# Altium footprint library R 6 DSX 04.PcbLib: 27 footprints (part 1 of 2)
Each footprint in its own frame and in the unit in brackets; x right, y up, seen from the top. Pads: shape width x height; smd on the part's side, far side on the other; paste and mask are expansions set on the pad; w line width, h text height; cw(c..) or ccw(c..) is an arc to the next point about the centre after c.
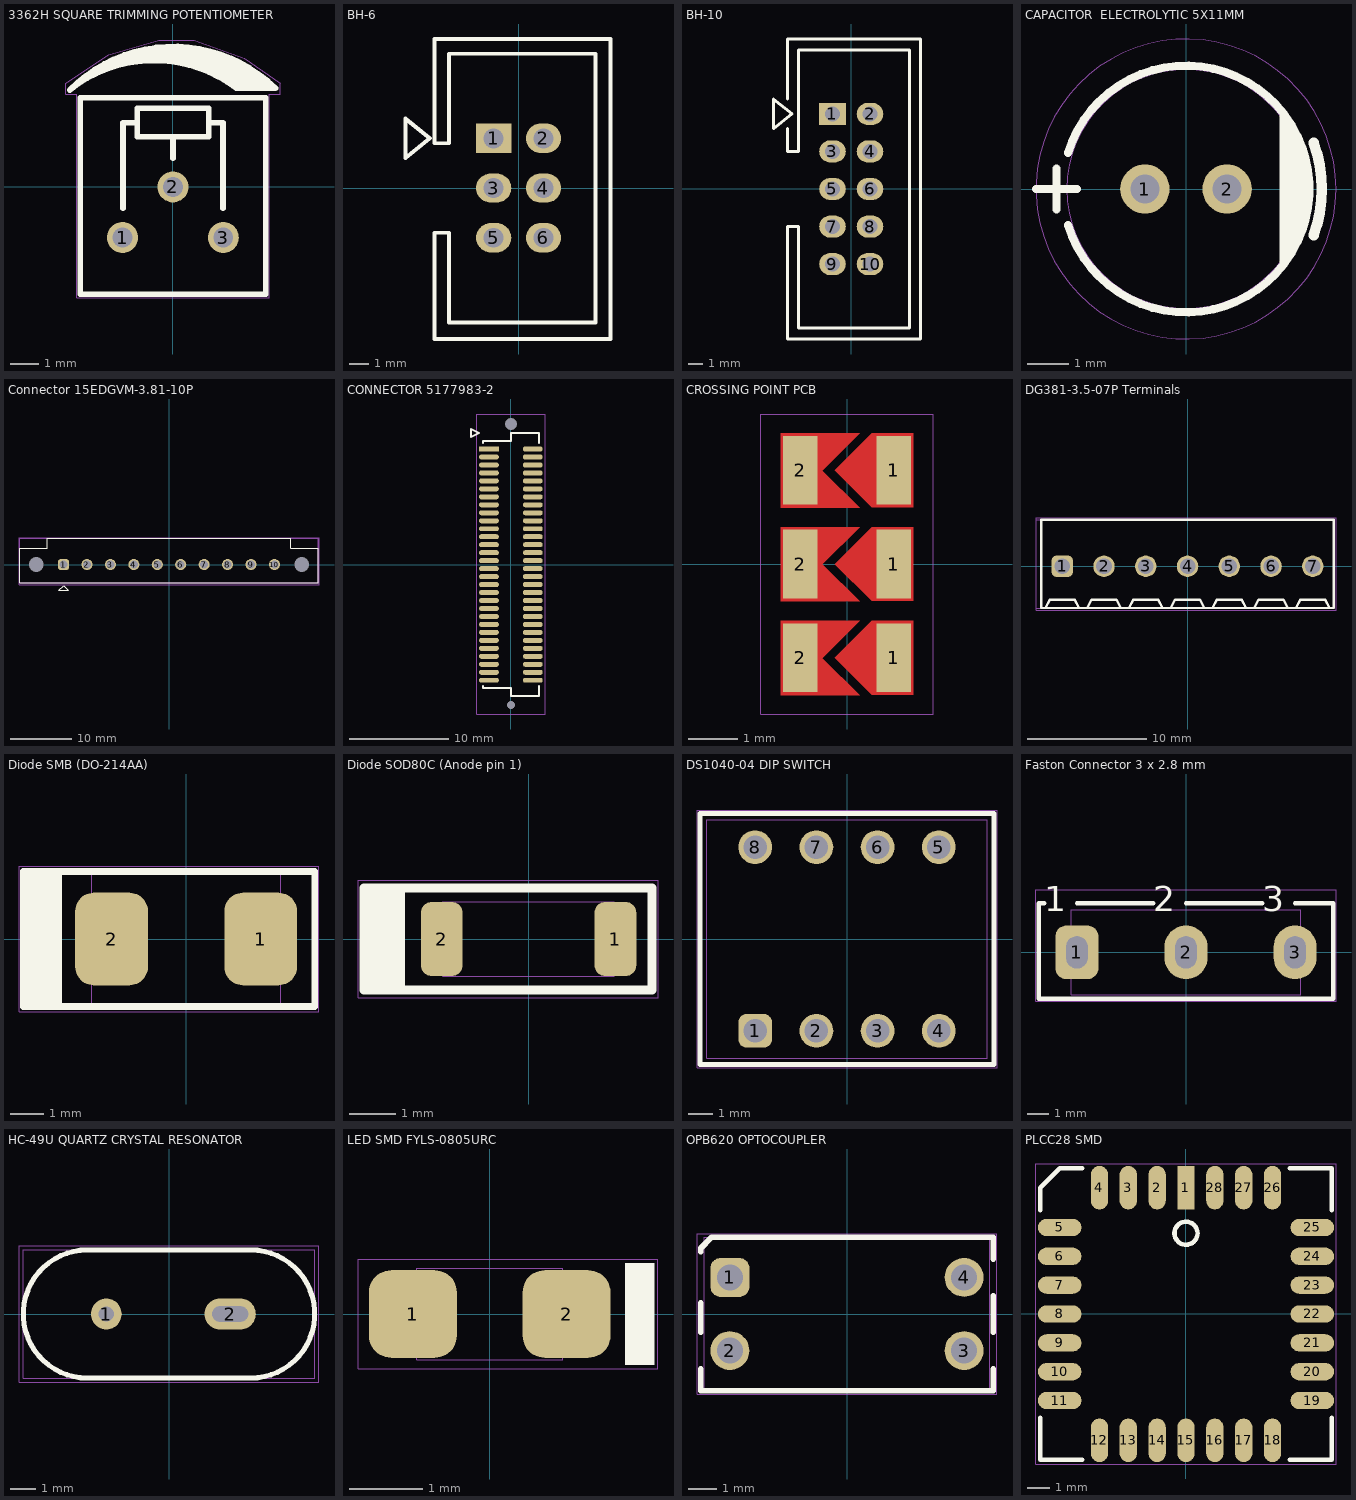
[diagram p0: the footprints below, top view; thin cyan lines are the x and y axes]

## 3362H SQUARE TRIMMING POTENTIOMETER [mm] "Square Trimpot® Trimming Potentiometer"
pads (3):
  round 1.1 / inner round 0 / far side oval 1.1x1.3 hole 0.7: 1(-1.792,-1.8) 2(0,0) 3(1.792,-1.8)
Top Overlay:
  region: 3.645,3.508 2.253,3.505 2.253,4.484
  region: 2.253,3.502 1.321,4.064 2.253,4.484
  region: 2.253,4.484 1.096,4.879 1.321,4.064
  region: 1.096,4.879 0.404,4.375 1.321,4.064
  region: 1.096,4.879 0.051,4.992 0.404,4.375
  region: 0.051,4.992 -0.449,4.493 0.404,4.375
  region: -0.449,4.493 -1.061,4.879 0.051,4.992
  region: -1.061,4.879 -1.751,4.375 -0.449,4.493
  region: -1.061,4.879 -2.201,4.493 -1.751,4.375
  region: -1.751,4.375 -2.667,4.064 -2.201,4.493
  lines w0.2: -1.778,-0.762 -1.778,2.286 -1.27,2.286 ; 0,1.016 0,1.778 ; 1.27,2.286 1.778,2.286 1.778,-0.762 ; 2.245,3.508 ccw(c-0.673,-0.302) -3.672,3.446 cw(c0.017,-0.181) 3.645,3.508 2.259,3.508 ; -3.3,-3.815 -3.3,3.175 3.3,3.175 3.3,-3.815 -3.3,-3.815 ; -1.27,1.778 -1.27,2.794 1.27,2.794 1.27,1.778 -1.27,1.778
Mechanical 3:
  lines w0.01: -3.81,3.302 -3.81,3.683 -2.286,4.699 -0.508,5.207 0.762,5.207 2.54,4.572 3.81,3.683 3.81,3.302 3.429,3.302 3.429,-3.937 -3.429,-3.937 -3.429,3.302 -3.81,3.302
Mechanical 7:
  lines w0.01: -3.3,-3.815 -3.3,3.175 3.3,3.175 3.3,-3.815 -3.3,-3.815
Mechanical 12:
  text ".Designator" at -2.181,-3.68 h4
3D body "3362H v2.STEP": height 4.75, standoff -3, extent -3.3,-3.815 3.3,3.175

## BH-6 [mm] "BH-6 (DS1013-06S) (IDC-6MS)"
height 6.86
pads (6):
  rect 1.8x1.5 hole 1.02: 1(-1.27,2.54)
  oval 1.8x1.5 hole 1.02: 2(1.27,2.54) 3(-1.27,0) 4(1.27,0) 5(-1.27,-2.54) 6(1.27,-2.54)
Top Overlay:
  lines w0.2: -5.778,1.54 -5.778,3.54 -4.528,2.54 -5.778,1.54 ; -4.303,-7.71 -4.303,-2.286 -3.556,-2.286 -3.556,-6.858 3.937,-6.858 3.937,6.858 -3.556,6.858 -3.556,2.286 -4.303,2.286 -4.303,7.61 4.697,7.61 4.697,-7.71 -4.303,-7.71
3D body "DS1013-6S (IDC-6MS, BH-6).step": height 9.05, standoff -3.55, extent -4.4,-7.71 4.4,7.71

## BH-10 [mm] "BH-10 (DS1013-10S) (IDC-10MS)"
height 6.86
pads (10):
  rect 1.8x1.5 hole 1.02: 1(-1.27,5.08)
  oval 1.8x1.5 hole 1.02: 2(1.27,5.08) 3(-1.27,2.54) 4(1.27,2.54) 5(-1.27,0) 6(1.27,0) 7(-1.27,-2.54) 8(1.27,-2.54) 9(-1.27,-5.08) 10(1.27,-5.08)
Top Overlay:
  lines w0.2: -4.303,4.08 -4.303,2.54 -3.556,2.54 -3.556,9.398 3.937,9.398 3.937,-9.398 -3.556,-9.398 -3.556,-2.54 -4.303,-2.54 -4.303,-10.15 4.697,-10.15 4.697,10.15 -4.303,10.15 -4.303,6.08 ; -5.27,4.08 -5.27,6.08 -4.02,5.08 -5.27,4.08
3D body "BH-10.STEP": height 8.95, standoff -3.45, extent -4.303,-10.15 4.697,10.15

## CAPACITOR  ELECTROLYTIC 5X11MM [mm] "Capacitor  electrolytic 5x11mm"
pads (2):
  round 1.2 / inner round 0 / far side oval 1.2x1.6 hole 0.7: 1(-1,0) 2(1,0)
Top Overlay:
  region: 2.286,1.904 2.286,-1.886 2.375,-1.81 2.536,-1.64 2.678,-1.453 2.799,-1.251 2.897,-1.038 2.972,-0.816 3.023,-0.587 3.048,-0.353 3.048,-0.236 3.048,0.254 3.048,0.371 3.023,0.605 2.972,0.834 2.897,1.056 2.799,1.269 2.678,1.471 2.536,1.658 2.375,1.828
  lines w0.2: -3.648,0 -2.648,0 ; -3.148,-0.5 -3.148,0.5 ; -2.87,-0.873 ccw(c0,0) -2.87,0.873
  lines w0.254: 3.103,-1.129 ccw(c0,0) 3.103,1.129
Mechanical 3:
  circle w0.01: c0,0 r3.648
Mechanical 7:
  circle w0.01: c0,0 r2.902
Mechanical 12:
  text ".Designator" at -2.1,1.5 h4
3D body "CAP_RAD_D5x11_POL_BK.stp": height 12.55, standoff -2.45, extent -2.75,-2.75 2.75,2.75

## Connector 15EDGVM-3.81-10P [mm] "15EDGVM-3.81-10P Connector 10 poles by Degson 3.81 mm pitch"
height 6.86
pads (12):
  round 0 hole 2.4 unplated: 0(-21.565,0) 0(21.565,0)
  rrect50% 1.8x1.8 / inner round 1.8 / far side rrect50% 1.8x2.5 hole 1.3: 1(-17.145,0)
  round 1.8 / inner round 1.8 / far side oval 1.8x2.5 hole 1.3: 2(-13.335,0) 3(-9.525,0) 4(-5.715,0) 5(-1.905,0) 6(1.905,0) 7(5.715,0) 8(9.525,0) 9(13.335,0) 10(17.145,0)
Top Overlay:
  lines w0.2: -24.254,-2.978 24.236,-2.978 24.236,2.667 19.794,2.667 19.794,4.262 -19.812,4.262 -19.812,2.667 -24.254,2.667 -24.254,-2.978 ; -17.907,-4.191 -17.145,-3.429 -16.383,-4.191 -17.907,-4.191
Mechanical 3:
  lines w0.01: -24.384,-3.238 -24.384,4.381 24.384,4.381 24.384,-3.238 -24.384,-3.238
Mechanical 7:
  lines w0.01: -24.254,-2.978 -24.254,4.262 24.236,4.262 24.236,-2.978 -24.254,-2.978
Mechanical 12:
  text ".Designator" at -5.473,1.508 h4
3D body "15EDGVM-3.81-10P-1Y-00A(H).stp": height 9.2, standoff -3.4, extent -24.254,-2.978 24.236,4.262

## CONNECTOR 5177983-2 [mm]
pads (62):
  rect 2x0.5 smd: 1(-2.2,11.6)
  oval 2x0.5 smd: 2(2.2,11.6) 3(-2.2,10.8) 4(2.2,10.8) 5(-2.2,10) 6(2.2,10) 7(-2.2,9.2) 8(2.2,9.2) 9(-2.2,8.4) 10(2.2,8.4) 11(-2.2,7.6) 12(2.2,7.6) 13(-2.2,6.8) 14(2.2,6.8) 15(-2.2,6) 16(2.2,6) 17(-2.2,5.2) 18(2.2,5.2) 19(-2.2,4.4) 20(2.2,4.4) 21(-2.2,3.6) 22(2.2,3.6) 23(-2.2,2.8) 24(2.2,2.8) 25(-2.2,2) 26(2.2,2) 27(-2.2,1.2) 28(2.2,1.2) 29(-2.2,0.4) 30(2.2,0.4) 31(-2.2,-0.4) 32(2.2,-0.4) 33(-2.2,-1.2) 34(2.2,-1.2) 35(-2.2,-2) 36(2.2,-2) 37(-2.2,-2.8) 38(2.2,-2.8) 39(-2.2,-3.6) 40(2.2,-3.6) 41(-2.2,-4.4) 42(2.2,-4.4) 43(-2.2,-5.2) 44(2.2,-5.2) 45(-2.2,-6) 46(2.2,-6) 47(-2.2,-6.8) 48(2.2,-6.8) 49(-2.2,-7.6) 50(2.2,-7.6) 51(-2.2,-8.4) 52(2.2,-8.4) 53(-2.2,-9.2) 54(2.2,-9.2) 55(-2.2,-10) 56(2.2,-10) 57(-2.2,-10.8) 58(2.2,-10.8) 59(-2.2,-11.6) 60(2.2,-11.6)
  round 0 hole 1.2 unplated: 61(0,14.1)
  round 0 hole 0.8 unplated: 62(0,-14.1)
Top Overlay:
  lines w0.2: -2.8,-12.2 -2.8,-12.4 0,-12.4 0,-13.2 2.8,-13.2 2.8,-12.2 ; -2.8,12.2 -2.8,12.4 0,12.4 0,13.2 2.8,13.2 2.8,12.2 ; -4,12.8 -3.2,13.2 -4,13.6 -4,12.8
Mechanical 3:
  lines w0.01: -3.429,-14.986 -3.429,-10.541 -3.429,15.113 3.429,15.113 3.429,-14.986 -3.429,-14.986
Mechanical 12:
  text ".Designator" at -4.286,-6.566 h4
3D body "c-5177983-2-a-3d.stp": height 3.8, standoff -0.45, extent -3,-14.9 3,14.9

## CROSSING POINT PCB [mm]
pads (6):
  rect 0.7x1.4 smd paste+0 mask+0: 1(0.95,-1.905) 1(0.95,0) 1(0.95,1.905) 2(-0.95,-1.905) 2(-0.95,0) 2(-0.95,1.905)
Top Layer:
  region: -0.25,-1.905 0.5,-2.655 1.35,-2.655 1.35,-1.155 0.5,-1.155
  region: -1.35,-1.155 0.254,-1.155 -0.502,-1.911 0.254,-2.667 -1.35,-2.667
  region: -1.35,0.75 0.254,0.75 -0.502,-0.006 0.254,-0.762 -1.35,-0.762
  region: -0.25,0 0.5,-0.75 1.35,-0.75 1.35,0.75 0.5,0.75
  region: -1.35,2.655 0.254,2.655 -0.502,1.899 0.254,1.143 -1.35,1.143
  region: -0.25,1.905 0.5,1.155 1.35,1.155 1.35,2.655 0.5,2.655
Top Solder:
  region: -1.45,-1.055 -1.45,-2.755 1.45,-2.755 1.45,-1.055
  region: -1.45,0.85 -1.45,-0.85 1.45,-0.85 1.45,0.85
  region: -1.45,2.755 -1.45,1.055 1.45,1.055 1.45,2.755
Mechanical 10:
  lines w0.01: -1.75,-3.048 1.75,-3.048 1.75,3.048 -1.75,3.048 -1.75,-3.048

## DG381-3.5-07P Terminals [mm] "DG381-3.5-07P Terminal 7 poles by Degson 3.5 mm pitch"
height 6.86
pads (7):
  rrect50% 1.8x1.8 / inner round 1.8 / far side rrect50% 1.8x2.5 hole 1.3: 1(-10.5,0)
  round 1.8 / inner round 1.8 / far side oval 1.8x2.5 hole 1.3: 2(-7,0) 3(-3.5,0) 4(0,0) 5(3.5,0) 6(7,0) 7(10.5,0)
Top Overlay:
  lines w0.2: -11.9,-3.5 -11.55,-2.8 -9.45,-2.8 -9.1,-3.5 ; -8.4,-3.5 -8.05,-2.8 -5.95,-2.8 -5.6,-3.5 ; -4.9,-3.5 -4.55,-2.8 -2.45,-2.8 -2.1,-3.5 ; -1.4,-3.5 -1.05,-2.8 1.05,-2.8 1.4,-3.5 ; 2.1,-3.5 2.45,-2.8 4.55,-2.8 4.9,-3.5 ; 5.6,-3.5 5.95,-2.8 8.05,-2.8 8.4,-3.5 ; 9.1,-3.5 9.45,-2.8 11.55,-2.8 11.9,-3.5 ; -12.25,-3.5 12.26,-3.5 12.26,3.9 -12.25,3.9 -12.25,-3.5
Mechanical 3:
  lines w0.01: -12.7,-3.683 12.446,-3.683 12.446,4.064 -12.7,4.064 -12.7,-3.683
Mechanical 7:
  lines w0.01: -12.66,-3.5 12.26,-3.5 12.26,3.9 -12.66,3.9 -12.66,-3.5
Mechanical 10:
  lines w0.01: -12.66,-3.5 12.26,-3.5 12.26,3.9 -12.66,3.9 -12.66,-3.5
Mechanical 12:
  text ".Designator" at 1.4,-8.4 h4
3D body "DG381-3.5-07P.stp": height 8.65, standoff -3.55, extent -12.66,-3.5 12.26,3.9

## Diode SMB (DO-214AA) [mm]
height 6.86
pads (2):
  rrect50% 2.159x2.743 smd: 1(2.21,0) 2(-2.21,0)
Top Overlay:
  rectangle: -4.828,-2.032 -3.683,2.032
  lines w0.2: -4.826,-2 3.81,-2 3.81,2 -4.826,2 -4.826,-2
Mechanical 3:
  lines w0.01: -4.953,-2.159 3.937,-2.159 3.937,2.159 -4.953,2.159 -4.953,-2.159
Mechanical 7:
  lines w0.01: -2.8,-2 -2.8,2 2.8,2 2.8,-2 -2.8,-2
Mechanical 12:
  text ".Designator" at -7.366,2.286 h4
3D body "DIOM4640X24_DO-214AA_SMB.STEP": height 2.6, standoff 0, extent -2.8,-2 2.8,2

## Diode SOD80C (Anode pin 1) [mm] "Diode SMA (Anode pin 1)"
height 6.86
pads (2):
  rrect50% 0.9x1.6 smd: 1(1.875,0) 2(-1.875,0)
Top Overlay:
  rectangle: -3.556,-1.2 -2.667,1.2
  lines w0.2: -3.556,-1.1 -3.556,1.1 2.667,1.1 2.667,-1.1 -3.556,-1.1
Mechanical 3:
  lines w0.01: -3.683,-1.27 2.794,-1.27 2.794,1.27 -3.683,1.27 -3.683,-1.27
Mechanical 7:
  lines w0.01: -1.85,-0.8 1.85,-0.8 1.85,0.8 -1.85,0.8 -1.85,-0.8
Mechanical 12:
  text ".Designator" at -6.731,1.27 h4
3D body "SOD80C.STEP": height 1.58, standoff -0.02, extent -1.85,-0.8 1.85,0.8

## DS1040-04 DIP SWITCH [mm] "DS1040-04 DIP-switch 4 channels NO by Connfly"
pads (8):
  rrect50% 1.4x1.4 / inner round 0 / far side rrect50% 1.5x2 hole 0.97: 1(-3.81,-3.81)
  round 1.4 / inner round 0 / far side oval 1.5x2 hole 0.97: 2(-1.27,-3.81) 3(1.27,-3.81) 4(3.81,-3.81) 5(3.81,3.81) 6(1.27,3.81) 7(-1.27,3.81) 8(-3.81,3.81)
Top Overlay:
  lines w0.2: -6.096,-5.207 -6.096,5.207 6.096,5.207 6.096,-5.207 -6.096,-5.207
Mechanical 3:
  lines w0.01: -6.223,-5.334 -6.223,5.334 6.223,5.334 6.223,-5.334 -5.207,-5.334 -6.223,-5.334
Mechanical 7:
  lines w0.01: -5.81,-4.95 -5.81,4.95 5.81,4.95 5.81,-4.95 -5.81,-4.95
Mechanical 12:
  text ".Designator" at -2.032,-1.778 h4
3D body "DS1040-04 (DIP_switch).stp": height 6.85, standoff -3.8, extent -5.81,-4.95 5.81,4.95

## Faston Connector 3 x 2.8 mm [mm] "Connector: 3 x Faston Pin 2.8 mm"
height 6.86
pads (3):
  rrect50% 2x2.5 / inner rrect50% 1.6x2 / far side rrect50% 2x2.5 hole 1.5 slot 1 at 0 deg: 1(-5.08,0)
  oval 2x2.5 / inner oval 1.6x2 / far side oval 2x2.5 hole 1.5 slot 1 at 0 deg: 2(0,0) 3(5.08,0)
Top Overlay:
  lines w0.2: -6.604,2.286 -6.858,2.286 -6.858,-2.159 6.858,-2.159 6.858,2.286 5.08,2.286 ; -5.08,2.286 -1.524,2.286 ; 0,2.286 3.556,2.286
  text "3" at 3.556,1.524 h2
  text "2" at -1.524,1.524 h2
  text "1" at -6.604,1.524 h2
Mechanical 3:
  lines w0.01: -6.985,-2.286 6.985,-2.286 6.985,2.921 -6.985,2.921 -6.985,-2.286
Mechanical 7:
  lines w0.01: -5.334,-1.981 5.334,-1.981 5.334,1.981 -5.334,1.981 -5.334,-1.981
Mechanical 12:
  text ".Designator" at -6.604,2.54 h4
3D body "c-62395-1-ae-3d.stp": height 8.45, standoff -3.93, extent 4.826,-1.981 5.334,1.981
3D body "c-62395-1-ae-3d.stp": height 8.45, standoff -3.93, extent -0.254,-1.981 0.254,1.981
3D body "c-62395-1-ae-3d.stp": height 8.45, standoff -3.93, extent -5.334,-1.981 -4.826,1.981

## HC-49U QUARTZ CRYSTAL RESONATOR [mm] "HC-49/U Standard Quartz Crystal"
pads (2):
  round 1.2 / inner round 0 / far side round 1.2 hole 0.6: 1(-2.44,0)
  oval 2x1.2 / inner round 0 / far side oval 2x1.2 hole 0.6 slot 1.4 at 0 deg: 2(2.382,0)
Top Overlay:
  lines w0.2: -3.178,-2.497 cw(c-3.178,0) -3.178,2.497 3.178,2.497 cw(c3.178,0) 3.178,-2.497 -3.178,-2.497
Mechanical 3:
  lines w0.01: -5.842,-2.667 -5.842,2.667 5.842,2.667 5.842,-2.667 -5.842,-2.667
Mechanical 7:
  lines w0.01: -5.675,-2.497 -5.675,2.503 5.675,2.503 5.675,-2.497 -5.675,-2.497
Mechanical 10:
  lines w0.01: -3.16,-2.491 cw(c-3.16,0.006) -3.16,2.503 3.196,2.503 cw(c3.196,0.006) 3.196,-2.491 -3.16,-2.491
Mechanical 12:
  text ".Designator" at -1.905,-0.508 h1
3D body "HC-49S(10.24MHz).STEP": height 3.8, standoff -2.5, extent -5.675,-2.497 5.675,2.503

## LED SMD FYLS-0805URC [mm] "FYLS-0805URC LED SMD"
height 6.86
pads (2):
  rrect50% 1.2x1.2 smd: 1(-1.05,0) 2(1.05,0)
Top Overlay:
  rectangle: 1.85,-0.7 2.25,0.7
Mechanical 3:
  lines w0.01: -1.8,-0.75 2.3,-0.75 2.3,0.75 -1.8,0.75 -1.8,-0.75
Mechanical 7:
  lines w0.01: -1,-0.625 1,-0.625 1,0.625 -1,0.625 -1,-0.625
Mechanical 13:
  text ".Designator" at -1.75,0.75 h4
3D body "FYLS-0805URC.STEP": height 0.81, standoff 0, extent -1,-0.625 1,0.625

## OPB620 OPTOCOUPLER [mm] "OPB620 Optocoupler by TT Electronics"
pads (4):
  rrect50% 1.35x1.35 / inner rrect50% 0x0 / far side rrect50% 1.7x1.7 hole 0.9: 1(-4.065,1.27)
  round 1.35 / inner round 0 / far side round 1.7 hole 0.9: 2(-4.065,-1.27) 3(4.065,-1.27) 4(4.065,1.27)
Top Overlay:
  lines w0.2: -5.08,-1.905 -5.08,-2.667 5.08,-2.667 5.08,-1.905 ; -5.08,-0.635 -5.08,0.381 ; -5.08,2.159 -5.08,2.286 -4.699,2.667 5.08,2.667 5.08,1.905 ; 5.08,-0.635 5.08,0.635
Mechanical 3:
  lines w0.01: -5.207,-2.794 -5.207,2.794 5.207,2.794 5.207,-1.651 5.207,-2.794 -5.207,-2.794
Mechanical 7:
  lines w0.01: -4.955,-2.665 -4.955,2.665 4.955,2.665 4.955,-2.665 -4.955,-2.665
Mechanical 12:
  text ".Designator" at -2.032,-0.508 h4
3D body "OPB620.STEP": height 9.27, standoff -2.16, extent -4.955,-2.665 4.955,2.665

## PLCC28 SMD [mm]
height 6.86
pads (28):
  rect 0.76x1.92 smd: 1(0,5.56)
  oval 0.76x1.92 smd: 2(-1.27,5.56) 3(-2.54,5.56) 4(-3.81,5.56) 12(-3.81,-5.56) 13(-2.54,-5.56) 14(-1.27,-5.56) 15(0,-5.56) 16(1.27,-5.56) 17(2.54,-5.56) 18(3.81,-5.56) 26(3.81,5.56) 27(2.54,5.56) 28(1.27,5.56)
  oval 1.92x0.76 smd: 5(-5.56,3.81) 6(-5.56,2.54) 7(-5.56,1.27) 8(-5.56,0) 9(-5.56,-1.27) 10(-5.56,-2.54) 11(-5.56,-3.81) 19(5.56,-3.81) 20(5.56,-2.54) 21(5.56,-1.27) 22(5.56,0) 23(5.56,1.27) 24(5.56,2.54) 25(5.56,3.81)
Top Overlay:
  circle w0.2: c0,3.556 r0.508
  lines w0.2: -6.42,-4.57 -6.42,-6.42 -4.57,-6.42 ; -6.42,4.57 -6.42,5.56 -5.56,6.42 -4.57,6.42 ; 4.57,-6.42 6.42,-6.42 6.42,-4.57 ; 4.57,6.42 6.42,6.42 6.42,4.57
Mechanical 3:
  lines w0.01: -6.604,-6.604 -6.604,6.604 6.604,6.604 6.604,-6.604 -6.604,-6.604
Mechanical 12:
  text ".Designator" at -6.604,7.112 h4
3D body "MT9172AP.STEP": height 4.57, standoff 0, extent -6.225,-6.225 6.225,6.225